# Altium footprint library PCBLIB.PcbLib: 557 footprints (part 22 of 36)
Each footprint in its own frame and in the unit in brackets; x right, y up, seen from the top. Pads: shape width x height; smd on the part's side, far side on the other; paste and mask are expansions set on the pad; w line width, h text height; cw(c..) or ccw(c..) is an arc to the next point about the centre after c.
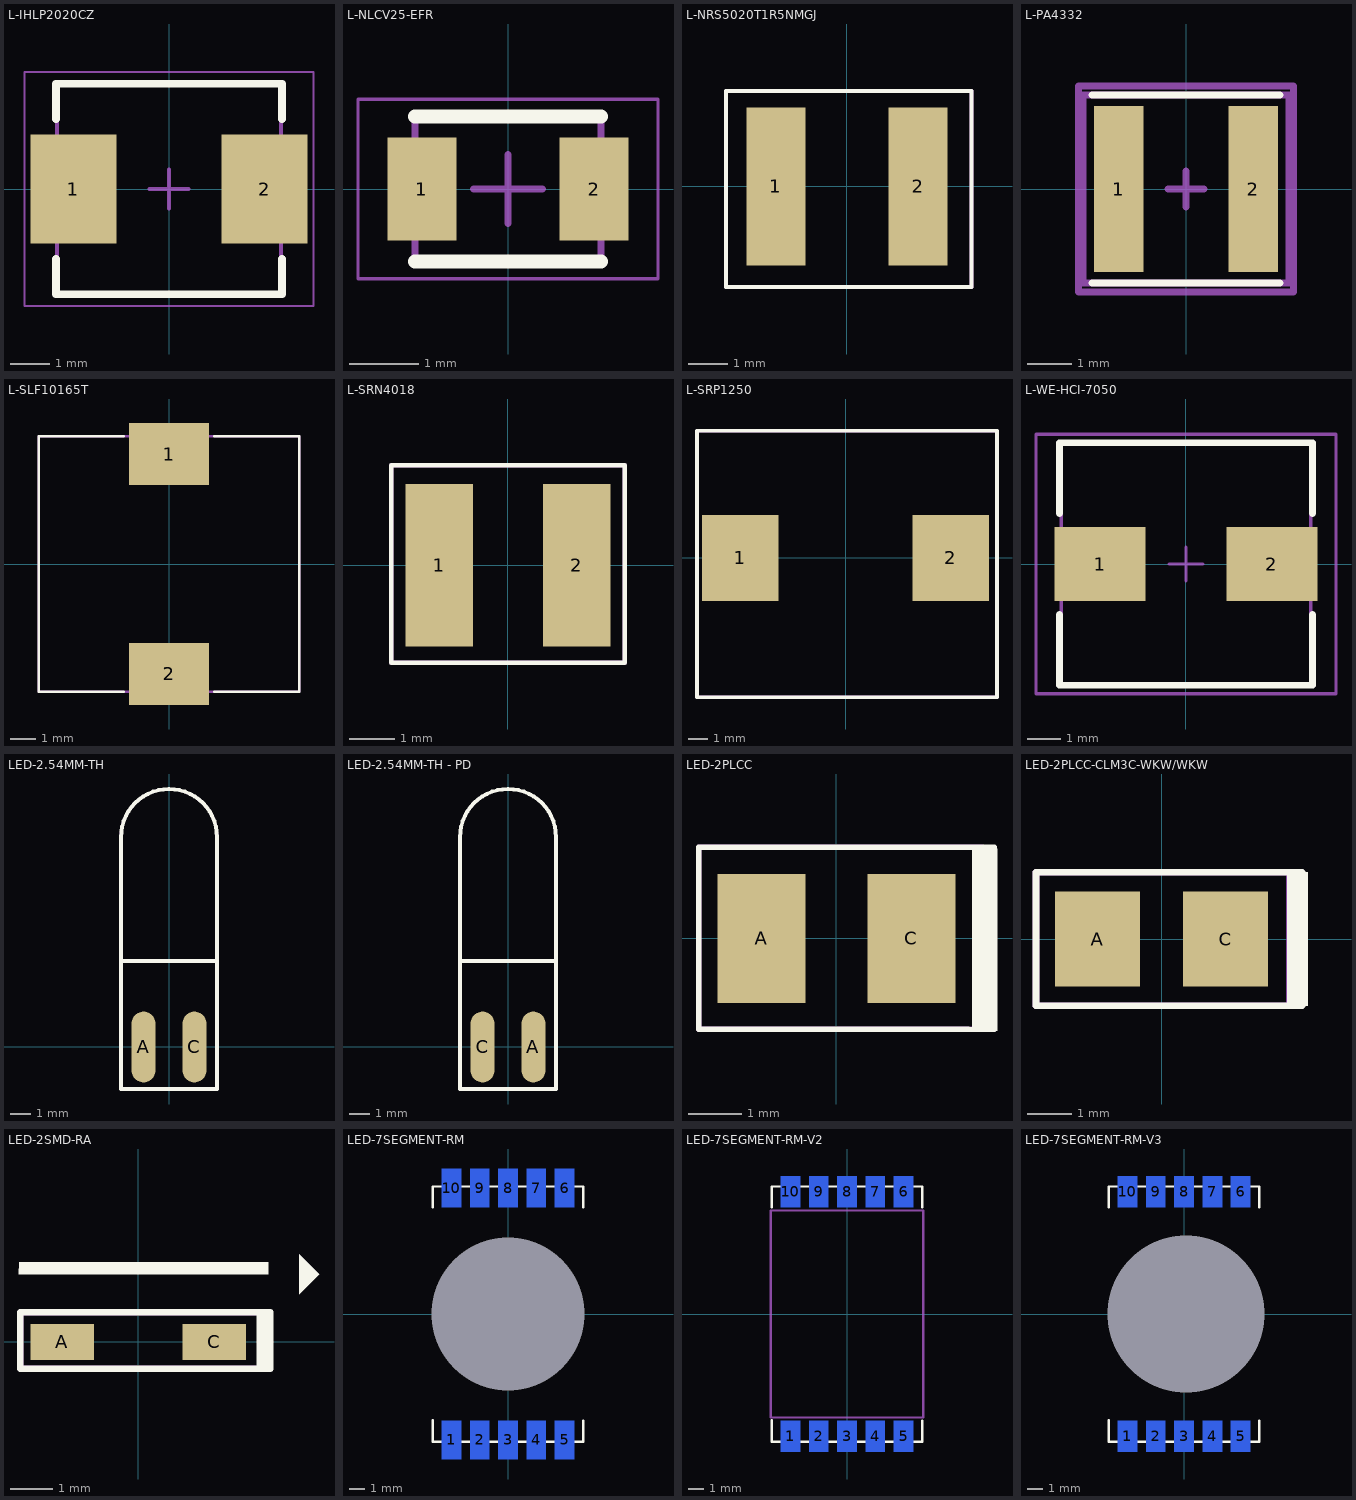
[diagram p21: the footprints below, top view; thin cyan lines are the x and y axes]

## L-IHLP2020CZ [mm] "Precision Wire Wound Inductor, 2-Leads, Body 5,49x5,18mm, IPC Medium Density"
height 3
pads (2):
  rect 2.2x2.79 smd: 1(-2.45,0) 2(2.45,0)
Top Overlay:
  lines w0.2: -2.9,-1.795 -2.9,-2.7 2.9,-2.7 2.9,-1.795 ; -2.9,1.795 -2.9,2.7 2.9,2.7 2.9,1.795
Mechanical 15:
  lines w0.05: -3.7,-3 3.7,-3 3.7,3 -3.7,3 -3.7,-3
  lines w0.1: -0.5,0 0.5,0 ; 0,-0.5 0,0.5
ASM Top:
  lines w0.1: -2.87,-2.715 2.87,-2.715 2.87,2.715 -2.87,2.715 -2.87,-2.715
  text ".designator" at -2.4,-0.2 h0.8
3D body "L-IHLP2020CZ.step": height 3.1, standoff 0, extent -2.845,-2.59 2.845,2.59

## L-NLCV25-EFR [mm] "TDK NLCV25-EFR Series"
height 1.9
pads (2):
  rect 1x1.5 smd: 1(-1.25,0) 2(1.25,0)
Top Overlay:
  lines w0.2: -1.35,-1.05 1.35,-1.05 ; -1.35,1.05 1.35,1.05
Mechanical 15:
  lines w0.05: -2.175,-1.3 2.175,-1.3 2.175,1.3 -2.175,1.3 -2.175,-1.3
  lines w0.1: -0.5,0 0.5,0 ; 0,-0.5 0,0.5
ASM Top:
  lines w0.1: -1.35,-1.05 1.35,-1.05 1.35,1.05 -1.35,1.05 -1.35,-1.05
  text ".designator" at -1.2,-0.6 h0.8
3D body "L-NLCV25-EFR.step": height 2, standoff 0, extent -1.35,-1 1.35,1

## L-NRS5020T1R5NMGJ [mm]
pads (2):
  rect 1.5x4 smd: 1(-1.8,0) 2(1.8,0)
Top Overlay:
  lines w0.102: -3.07,-2.54 3.153,-2.54 3.153,2.413 -3.07,2.413 -3.07,-2.54
ASM Top:
  lines w0.102: -3.07,-2.54 -3.07,2.413 3.153,2.413 3.153,-2.54 -3.07,-2.54
  text ".designator" at -0.7,-0.2 h0.8
3D body "NRS5020T1R5NMGJ .STEP": height 3.01, standoff 0.01, extent -2.45,-2.512 2.45,2.388

## L-PA4332 [mm]
height 2
pads (2):
  rect 1.1x3.7 smd: 1(-1.5,0) 2(1.5,0)
Top Overlay:
  lines w0.15: -2.1,-2.1 2.1,-2.1 ; -2.1,2.1 2.1,2.1
Mechanical 15:
  lines w0.15: -0.4,0 0.4,0 ; 0,-0.4 0,0.4 ; -2.4,-2.3 -2.4,2.3 2.4,2.3 2.4,-2.3 2.1,-2.3 -2.4,-2.3
ASM Top:
  lines w0.15: -2.3,-2.1 -2.3,2.1 2.3,2.1 2.3,-2.1 -2.3,-2.1
  text ".designator" at -0.3,-0.3 h1.5
3D body "Ind_Pulse_PA4332_102NLT_eec.STEP": height 2, standoff 0, extent -2.1,-2.1 2.1,2.1

## L-SLF10165T [mil]
pads (2):
  rect 126x98 smd: 1(0,173) 2(0,-173)
Top Overlay:
  lines w4: -71,-201 -205,-201 -205,201 -71,201 ; 71,-201 205,-201 205,201 71,201
ASM Top:
  lines w4: -205,-201 -205,201 205,201 205,-201 -205,-201
  text ".designator" at -3.94,-3.94 h31.5
3D body "SLF10165T-100M3R8-3PF.stp": height 268.22, standoff 0.5, extent -198.82,-198.82 198.82,198.82

## L-SRN4018 [mm]
pads (2):
  rect 1.5x3.6 smd: 1(-1.525,0) 2(1.525,0)
Top Overlay:
  lines w0.102: -2.591,-2.159 -2.591,2.21 2.591,2.21 2.591,-2.159 -2.591,-2.159
ASM Top:
  lines w0.102: -2.591,-2.159 2.591,-2.159 2.591,2.21 -2.591,2.21 -2.591,-2.159
  text ".designator" at -2.134,-0.711 h0.8
3D body "srn4018.stp": height 1.81, standoff 0.01, extent -2.225,-2 2.175,2

## L-SRP1250 [mm]
pads (2):
  rect 4x4.5 smd: 1(-5.5,0) 2(5.5,0)
Top Overlay:
  lines w0.2: -7.772,-7.29 -7.772,6.655 7.925,6.655 7.925,-7.29 -7.772,-7.29
ASM Top:
  lines w0.2: -7.772,-7.29 7.925,-7.29 7.925,6.655 -7.772,6.655 -7.772,-7.29
  text ".designator" at -0.7,-0.2 h0.8
3D body "srp1250.stp": height 5.91, standoff 0.01, extent -6.963,-7.055 6.937,6.445

## L-WE-HCI-7050 [mm] "SMD Inductor, 2-Leads, Body 7.0 x 6.9 mm"
height 5
pads (2):
  rect 2.7x2.2 smd: 1(-2.55,0) 2(2.55,0)
Top Overlay:
  lines w0.2: -3.75,-1.5 -3.75,-3.6 3.75,-3.6 3.75,-1.5 ; -3.75,1.5 -3.75,3.6 3.75,3.6 3.75,1.5
Mechanical 15:
  lines w0.1: -0.5,0 0.5,0 ; 0,-0.5 0,0.5 ; -4.45,-3.85 4.45,-3.85 4.45,3.85 -4.45,3.85 -4.45,-3.85
ASM Top:
  lines w0.1: -3.7,-3.6 3.7,-3.6 3.7,3.6 -3.7,3.6 -3.7,-3.6
  text ".designator" at -0.406,-0.203 h0.8
3D body "744314200.stp": height 4.98, standoff -0.02, extent -3.5,-3.45 3.5,3.45

## LED-2.54MM-TH [mm]
pads (2):
  oval 1.2x3.54 smd mask+0.05: A(-1.27,0) C(1.27,0)
Top Overlay:
  lines w0.2: -2.4,4.25 -2.4,10.5 cw(c0,10.5) 2.4,10.5 2.4,4.3 -2.4,4.3 -2.4,4.2 -2.4,-2.1 2.4,-2.1 2.4,4.2
ASM Top:
  lines w0.15: -2.403,10.487 cw(c0,10.487) 2.4,10.599 2.4,-2.1 -2.388,-2.1 -2.388,10.487
3D body "User Library-LED5MM.step": height 5.95, standoff 0.05, extent -2.951,-2.6 2.951,13

## LED-2.54MM-TH - PD [mm]
pads (2):
  oval 1.2x3.54 smd mask+0.05: A(1.27,0) C(-1.27,0)
Top Overlay:
  lines w0.2: -2.4,4.25 -2.4,10.5 cw(c0,10.5) 2.4,10.5 2.4,4.3 -2.4,4.3 -2.4,4.2 -2.4,-2.1 2.4,-2.1 2.4,4.2
3D body "User Library-LED5MM.step": height 5.95, standoff 0.05, extent -2.951,-2.6 2.951,13

## LED-2PLCC [mm]
pads (2):
  rect 1.65x2.41 smd: A(-1.4,0) C(1.4,0)
Top Overlay:
  region: 2.537,1.676 2.537,-1.727 2.997,-1.727 2.997,1.676
  lines w0.1: 2.461,-1.702 2.946,-1.702 ; 2.461,1.702 2.946,1.702
  lines w0.102: 2.461,-1.702 -2.568,-1.702 -2.568,1.702 2.461,1.702
ASM Top:
  lines w0.102: -2.568,-1.702 2.461,-1.702 2.718,-1.702 2.718,-0.708 2.718,1.013 2.718,1.702 2.461,1.702 -2.568,1.702 -2.568,-1.702
  text ".designator" at -2.187,-1.168 h0.8
3D body: height 0.25, standoff 0, extent -0.13,0.876 -0.13,0.876
3D body "2plcc.STEP": height 2.11, standoff 0.01, extent -1.832,-1.5 1.928,1.5

## LED-2PLCC-CLM3C-WKW/WKW [mil]
pads (2):
  rect 75x84 smd: A(-56.5,0) C(56.5,0)
Top Overlay:
  region: 154,-1
  region: 148,56
  region: 129.22,-59 111,-59 111,59 129.22,59
  lines w6: 124,-59 -111,-59 -111,59 124,59
ASM Top:
  lines w6: -111,-59 -111,59 113,59 113,-59 -111,-59
  text ".designator" at -85,-28 h31.5
3D body "2PLCC-LED.STEP": height 73.73, standoff 0.5, extent -67,-55.23 70.79,55

## LED-2SMD-RA [mm]
pads (2):
  rect 1.5x0.85 smd: A(-1.8,0) C(1.8,0)
Top Overlay:
  region: 4.27,1.6 3.8,2.07 3.8,1.13
  region: 3.124,-0.635 2.794,-0.635 2.794,0.7 3.124,0.7
  region: -2.82,1.879 3.073,1.879 3.073,1.6 0.127,1.6 -2.82,1.6
  lines w0.152: -2.794,-0.635 3.124,-0.635 3.124,0.559 3.124,0.7 -2.794,0.7 -2.794,-0.635
ASM Top:
  region: 2.794,0.889
  lines w0.152: -2.794,-0.635 3,-0.635 3,-0.155 3,0.7 -2.794,0.7 -2.794,-0.635
  text ".designator" at -3.3,-2 h0.8
3D body "right angle led.STEP": height 0.61, standoff 0.01, extent -1.895,-0.483 1.905,0.517

## LED-7SEGMENT-RM [mil]
pads (11):
  rect 50x100 smd far side: 1(-146,-325) 2(-73,-325) 3(0,-325) 4(73,-325) 5(146,-325) 6(146,325) 7(73,325) 8(0,325) 9(-73,325) 10(-146,325)
  round 1 hole 394 square unplated: 4(0,0)
Top Overlay:
  lines w6: -194,-274 -194,-330 194,-330 194,-275 ; -194,275 -194,329 194,329 194,275
Bottom Overlay:
  lines w6: -194,-338 -194,-387 194,-387 194,-338 ; -194,338 -194,387 194,387 194,338 ; -194,-267 -194,267 194,267 194,-267 -194,-267

## LED-7SEGMENT-RM-V2 [mil]
pads (10):
  rect 50x80 smd far side: 1(-146,-315) 2(-73,-315) 3(0,-315) 4(73,-315) 5(146,-315) 6(146,315) 7(73,315) 8(0,315) 9(-73,315) 10(-146,315)
Top Overlay:
  lines w6: -194,-274 -194,-330 194,-330 194,-275 ; -194,275 -194,329 194,329 194,275
Bottom Overlay:
  lines w6: -194,-338 -194,-387 194,-387 194,-338 ; -194,338 -194,387 194,387 194,338 ; -194,-267 194,-267 194,267 -194,267 -194,-267
ASM Top:
  lines w6: -197,-267 197,-267 197,267 -197,267 -197,-267

## LED-7SEGMENT-RM-V3 [mil]
pads (11):
  rect 50x80 smd far side: 1(-146,-315) 2(-73,-315) 3(0,-315) 4(73,-315) 5(146,-315) 6(146,315) 7(73,315) 8(0,315) 9(-73,315) 10(-146,315)
  round 1 hole 404 square unplated: 4(5,0)
Top Overlay:
  lines w6: -194,-274 -194,-330 194,-330 194,-275 ; -194,275 -194,329 194,329 194,275
Bottom Overlay:
  lines w6: -194,-338 -194,-387 194,-387 194,-338 ; -194,338 -194,387 194,387 194,338 ; -194,-267 194,-267 194,267 -194,267 -194,-267